# Altium footprint library Ultrascale_PcbLib.PcbLib: 126 footprints (part 7 of 8)
Each footprint in its own frame and in the unit in brackets; x right, y up, seen from the top. Pads: shape width x height; smd on the part's side, far side on the other; paste and mask are expansions set on the pad; w line width, h text height; cw(c..) or ccw(c..) is an arc to the next point about the centre after c.
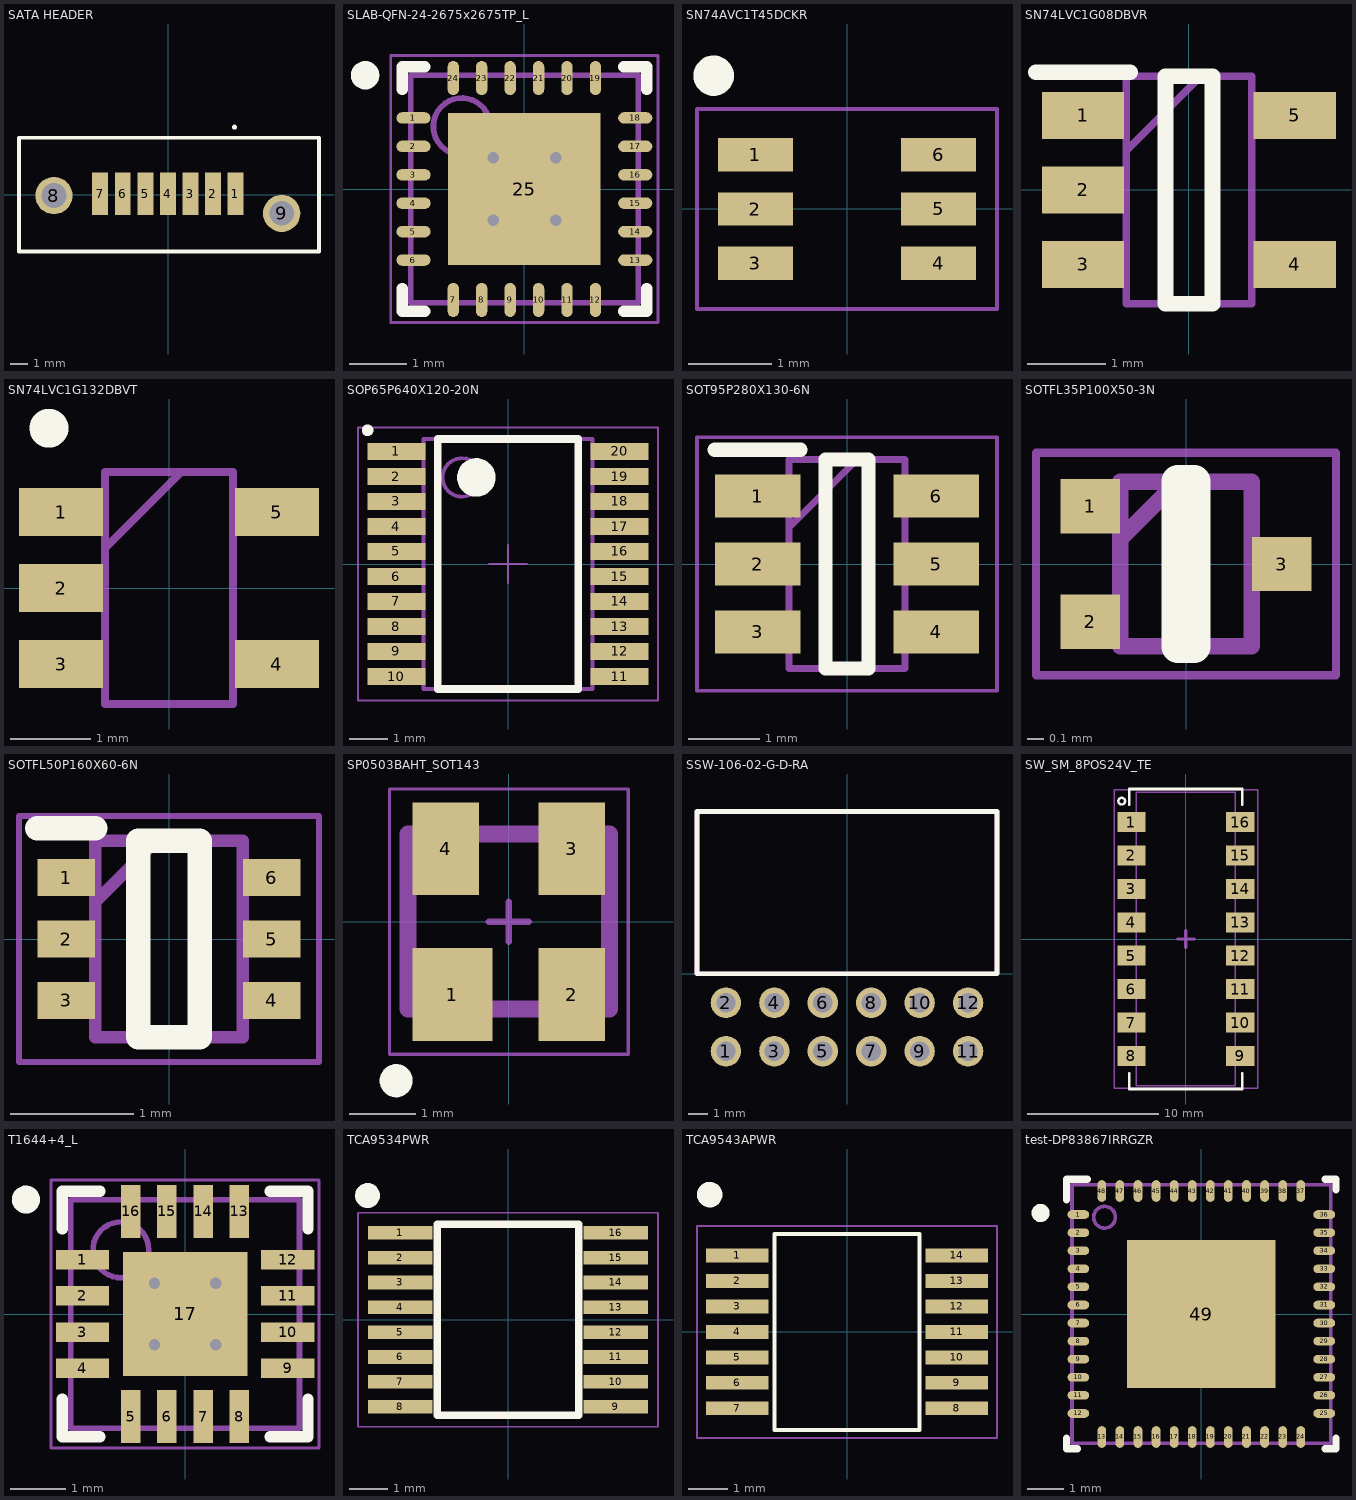
[diagram p6: the footprints below, top view; thin cyan lines are the x and y axes]

## SATA HEADER [mm] "CONN HEADER 7POS VERT SMD 15GOLD"
pads (9):
  rect 0.9x2.4 smd: 1(3.795,0.05) 2(2.525,0.05) 3(1.255,0.05) 4(-0.015,0.05) 5(-1.285,0.05) 6(-2.555,0.05) 7(-3.825,0.05)
  round 2.1 hole 1.4: 8(-6.43,-0.05) 9(6.4,-1.05)
Top Overlay:
  circle w0.2: c3.737,3.8 r0.04
  lines w0.2: -8.4,-3.2 -8.4,3.2 8.5,3.2 8.5,-3.2 -8.4,-3.2
3D body "678005005.stp": height 8.41, standoff -2.64, extent -8.45,-3.225 8.45,3.225

## SLAB-QFN-24-2675x2675TP_L [mm] "QFN, 24-Leads, Body 4x4mm, Pitch 0.5mm, Thermal Pad 2.68x2.68mm, IPC High Density"
height 0.8
pads (25):
  oval 0.6x0.2 smd mask+0.05: 1(-1.95,1.25) 2(-1.95,0.75) 3(-1.95,0.25) 4(-1.95,-0.25) 5(-1.95,-0.75) 6(-1.95,-1.25) 13(1.95,-1.25) 14(1.95,-0.75) 15(1.95,-0.25) 16(1.95,0.25) 17(1.95,0.75) 18(1.95,1.25)
  oval 0.2x0.6 smd mask+0.05: 7(-1.25,-1.95) 8(-0.75,-1.95) 9(-0.25,-1.95) 10(0.25,-1.95) 11(0.75,-1.95) 12(1.25,-1.95) 19(1.25,1.95) 20(0.75,1.95) 21(0.25,1.95) 22(-0.25,1.95) 23(-0.75,1.95) 24(-1.25,1.95)
  rect 2.68x2.68 smd mask+0.05: 25(0,0)
via -0.55,0.55 diameter 0.5 hole 0.2
via 0.55,0.55 diameter 0.5 hole 0.2
via -0.55,-0.55 diameter 0.5 hole 0.2
via 0.55,-0.55 diameter 0.5 hole 0.2
Top Overlay:
  circle w0.25: c-2.8,2 r0.125
  lines w0.2: -2.15,-1.75 -2.15,-2.15 -1.75,-2.15 ; -2.15,1.75 -2.15,2.15 -1.75,2.15 ; 1.75,-2.15 2.15,-2.15 2.15,-1.75 ; 1.75,2.15 2.15,2.15 2.15,1.75
Mechanical 13:
  circle w0.1: c-1.1,1.1 r0.5
  lines w0.1: -2,-2 -2,2 2,2 2,-2 -2,-2
Mechanical 15:
  lines w0.05: -2.35,-2.35 -2.35,2.35 2.35,2.35 2.35,-2.35 -2.35,-2.35
  lines w0.1: -0.5,0 0.5,0 ; 0,-0.5 0,0.5
3D body: height 0.8, standoff 0, extent -2,-2 2,2

## SN74AVC1T45DCKR [mm] "IC BUS TRANSCVR TRI-ST SC70-6"
pads (6):
  rect 0.9x0.4 smd mask+0.05: 1(-1.1,0.65) 2(-1.1,0) 3(-1.1,-0.65) 4(1.1,-0.65) 5(1.1,0) 6(1.1,0.65)
Top Overlay:
  circle w0.325: c-1.6,1.6 r0.08
Mechanical 20:
  lines w0.05: -1.8,-1.2 1.8,-1.2 1.8,1.2 -1.8,1.2 -1.8,-1.2
3D body "DCK6.step": height 1.09, standoff 0, extent -1.206,-1.08 1.206,1.08

## SN74LVC1G08DBVR [mm] "IC GATE AND 1CH 2-INP SOT-23-5"
pads (5):
  rect 1.05x0.6 smd mask+0.07: 1(-1.35,0.95) 2(-1.35,0) 3(-1.35,-0.95) 4(1.35,-0.95) 5(1.35,0.95)
Top Overlay:
  lines w0.2: -1.95,1.5 -0.75,1.5 ; -0.3,-1.45 -0.3,1.45 0.3,1.45 0.3,-1.45 -0.3,-1.45
Mechanical 15:
  lines w0.1: -0.8,0.5 0.15,1.45 ; -0.8,-1.45 -0.8,1.45 0.8,1.45 0.8,-1.45 -0.8,-1.45
3D body "SN74LVC1G08DBVR.stp": height 1.45, standoff 0, extent -1.4,-1.45 1.4,1.45

## SN74LVC1G132DBVT [mm] "IC GATE NAND 1CH 2-INP SOT-23-5"
pads (5):
  rect 1.05x0.6 smd mask+0.07: 1(-1.35,0.95) 2(-1.35,0) 3(-1.35,-0.95) 4(1.35,-0.95) 5(1.35,0.95)
Top Overlay:
  circle w0.325: c-1.5,2 r0.08
Mechanical 15:
  lines w0.1: -0.8,0.5 0.15,1.45 ; -0.8,-1.45 0.8,-1.45 0.8,1.45 -0.8,1.45 -0.8,-1.45
3D body "DBV5.step": height 1.45, standoff 0, extent -1.499,-1.524 1.499,1.524

## SOP65P640X120-20N [mm] "SOP, 20-Leads, Body 6.5x4.4mm, Pitch 0.65mm, IPC Medium Density"
height 1.2
pads (20):
  rect 1.5x0.45 smd: 1(-2.9,2.925) 2(-2.9,2.275) 3(-2.9,1.625) 4(-2.9,0.975) 5(-2.9,0.325) 6(-2.9,-0.325) 7(-2.9,-0.975) 8(-2.9,-1.625) 9(-2.9,-2.275) 10(-2.9,-2.925) 11(2.9,-2.925) 12(2.9,-2.275) 13(2.9,-1.625) 14(2.9,-0.975) 15(2.9,-0.325) 16(2.9,0.325) 17(2.9,0.975) 18(2.9,1.625) 19(2.9,2.275) 20(2.9,2.925)
Top Overlay:
  circle w0.5: c-0.825,2.25 r0.25
  circle w0.254: c-3.65,3.475 r0.025
  lines w0.2: -1.825,-3.25 1.825,-3.25 1.825,3.25 -1.825,3.25 -1.825,-3.25
Mechanical 14:
  circle w0.1: c-1.2,2.25 r0.5
  lines w0.1: -2.2,-3.25 2.2,-3.25 2.2,3.25 -2.2,3.25 -2.2,-3.25
Mechanical 15:
  lines w0.05: -0.5,0 0.5,0 ; 0,-0.5 0,0.5 ; -3.9,-3.55 3.9,-3.55 3.9,3.55 -3.9,3.55 -3.9,-3.55
3D body "SOP65P640X120-20N.stp": height 1.2, standoff 0, extent -3.121,-3.3 3.121,3.3

## SOT95P280X130-6N [mm] "TVS DIODE 20VWM SMD"
pads (6):
  rect 1.2x0.6 smd: 1(-1.25,0.95) 2(-1.25,0) 3(-1.25,-0.95) 4(1.25,-0.95) 5(1.25,0) 6(1.25,0.95)
Top Overlay:
  lines w0.2: -1.85,1.6 -0.65,1.6 ; -0.3,-1.462 0.3,-1.462 0.3,1.462 -0.3,1.462 -0.3,-1.462
Mechanical 15:
  lines w0.1: -0.812,0.512 0.138,1.462 ; -0.812,-1.462 0.812,-1.462 0.812,1.462 -0.812,1.462 -0.812,-1.462
Mechanical 20:
  lines w0.05: -2.1,-1.775 2.1,-1.775 2.1,1.775 -2.1,1.775 -2.1,-1.775

## SOTFL35P100X50-3N [mm] "TVS DIODE 5.5VWM 8VC SOT3"
pads (3):
  rect 0.36x0.33 smd: 1(-0.58,0.35) 2(-0.58,-0.35) 3(0.58,0)
Top Overlay:
  lines w0.2: -0.05,-0.5 0.05,-0.5 0.05,0.5 -0.05,0.5 -0.05,-0.5
Mechanical 15:
  lines w0.1: -0.4,0.15 -0.05,0.5 ; -0.4,-0.5 0.4,-0.5 0.4,0.5 -0.4,0.5 -0.4,-0.5
Mechanical 20:
  lines w0.05: -0.91,-0.675 0.91,-0.675 0.91,0.675 -0.91,0.675 -0.91,-0.675

## SOTFL50P160X60-6N [mm] "TVS DIODE 5.5VWM SOT6"
pads (6):
  rect 0.47x0.3 smd: 1(-0.835,0.5) 2(-0.835,0) 3(-0.835,-0.5) 4(0.835,-0.5) 5(0.835,0) 6(0.835,0.5)
Top Overlay:
  lines w0.2: -1.07,0.9 -0.6,0.9 ; -0.25,-0.8 -0.25,0.8 0.25,0.8 0.25,-0.8 -0.25,-0.8
Mechanical 15:
  lines w0.1: -0.6,0.3 -0.1,0.8 ; -0.6,-0.8 -0.6,0.8 0.6,0.8 0.6,-0.8 -0.6,-0.8
Mechanical 20:
  lines w0.05: -1.22,-1 -1.22,1 1.22,1 1.22,-1 -1.22,-1
3D body "DRL6.step": height 0.61, standoff 0, extent -0.851,-0.851 0.851,0.851

## SP0503BAHT_SOT143 [mm] "LITTELFUSE TVS DIODE 5.5VWM 8.5VC SOT143"
height 1.22
pads (4):
  rect 1.2x1.4 smd paste+0.05: 1(-0.85,-1.1)
  rect 1x1.4 smd paste+0.05: 2(0.95,-1.1) 3(0.95,1.1) 4(-0.95,1.1)
Top Overlay:
  circle w0.25: c-1.7,-2.4 r0.125
Mechanical 13:
  lines w0.254: -1.52,-1.32 1.52,-1.32 1.52,1.32 -1.52,1.32 -1.52,-1.32
Mechanical 15:
  lines w0.05: -1.8,-2 1.8,-2 1.8,2 -1.8,2 -1.8,-2
  lines w0.1: -0.3,0 0.3,0 ; 0,-0.3 0,0.3
3D body: height 1.22, standoff 0, extent -1.52,-1.32 1.52,1.32

## SSW-106-02-G-D-RA [mm]
pads (12):
  round 1.6 hole 1.02: 1(-6.35,-4.064) 2(-6.35,-1.524) 3(-3.81,-4.064) 4(-3.81,-1.524) 5(-1.27,-4.064) 6(-1.27,-1.524) 7(1.27,-4.064) 8(1.27,-1.524) 9(3.81,-4.064) 10(3.81,-1.524) 11(6.35,-4.064) 12(6.35,-1.524)
Top Overlay:
  lines w0.254: -7.87,0 7.87,0 7.87,8.51 -7.87,8.51 -7.87,0
Mechanical 15:
  lines w0.254: -7.87,0 -7.87,8.51 7.87,8.51 7.87,0 -7.87,0
3D body "SSW-106-02-T-D-RA.stp": height 4.97, standoff -2.51, extent -7.874,-4.267 7.874,8.509

## SW_SM_8POS24V_TE [mil] "Switch DIP8 SMD Gull Wing"
height 137.8
pads (16):
  rect 85x60 smd: 1(-162.6,350) 2(-162.6,250) 3(-162.6,150) 4(-162.6,50) 5(-162.6,-50) 6(-162.6,-150) 7(-162.6,-250) 8(-162.6,-350) 9(162.6,-350) 10(162.6,-250) 11(162.6,-150) 12(162.6,-50) 13(162.6,50) 14(162.6,150) 15(162.6,250) 16(162.6,350)
Top Overlay:
  circle w7.01: c-191.83,412.35 r10.09
  lines w7.87: -169.29,-401.57 -169.29,-448.82 169.29,-448.82 169.29,-440.94 169.29,-401.57 ; -169.29,401.57 -169.29,440.94 -169.29,448.82 169.29,448.82 169.29,401.57
Mechanical 11:
  lines w3.94: -147.64,-438.98 147.64,-438.98 147.64,438.98 -147.64,438.98 -147.64,-438.98
  text "1" at -100,350 h39.37
Mechanical 15:
  lines w3.94: -213.58,-446.85 -213.58,446.85 214.57,446.85 214.57,-446.85 -213.58,-446.85
  lines w10: -25,0 25,0 ; 0,-25 0,25
3D body "DIP8_SMD_gullwing_c-1-1825058-9-o-3d.stp": height 215.75, standoff -0.79, extent -184.78,-438.98 184.79,438.97

## T1644+4_L [mm] "QFN, 16-Leads, Body 4x4mm, Pitch 0.65mm, Thermal Pad 2.3x2.3mm, IPC High Density"
height 0.8
pads (17):
  rect 0.95x0.35 smd mask+0.05: 1(-1.84,0.975) 2(-1.84,0.325) 3(-1.84,-0.325) 4(-1.84,-0.975) 9(1.84,-0.975) 10(1.84,-0.325) 11(1.84,0.325) 12(1.84,0.975)
  rect 0.35x0.95 smd mask+0.05: 5(-0.975,-1.84) 6(-0.325,-1.84) 7(0.325,-1.84) 8(0.975,-1.84) 13(0.975,1.84) 14(0.325,1.84) 15(-0.325,1.84) 16(-0.975,1.84)
  rect 2.23x2.23 smd mask+0.05: 17(0,0)
via -0.55,0.55 diameter 0.5 hole 0.2
via 0.55,0.55 diameter 0.5 hole 0.2
via -0.55,-0.55 diameter 0.5 hole 0.2
via 0.55,-0.55 diameter 0.5 hole 0.2
Top Overlay:
  circle w0.25: c-2.85,2.05 r0.125
  lines w0.2: -2.2,-1.525 -2.2,-2.2 -1.525,-2.2 ; -2.2,1.525 -2.2,2.2 -1.525,2.2 ; 1.525,-2.2 2.2,-2.2 2.2,-1.525 ; 1.525,2.2 2.2,2.2 2.2,1.525
Mechanical 13:
  circle w0.1: c-1.15,1.15 r0.5
  lines w0.1: -2.05,-2.05 -2.05,2.05 2.05,2.05 2.05,-2.05 -2.05,-2.05
Mechanical 15:
  lines w0.05: -2.4,-2.4 -2.4,2.4 2.4,2.4 2.4,-2.4 -2.4,-2.4
  lines w0.1: -0.5,0 0.5,0 ; 0,-0.5 0,0.5
3D body: height 0.8, standoff 0, extent -2.05,-2.05 2.05,2.05

## TCA9534PWR [mil] "IC I/O EXPANDER I2C 8B 16TSSOP"
pads (16):
  rect 66x14 smd: 1(-111,89.57) 2(-111,63.98) 3(-111,38.39) 4(-111,12.8) 5(-111,-12.8) 6(-111,-38.39) 7(-111,-63.98) 8(-111,-89.57) 9(111,-89.57) 10(111,-63.98) 11(111,-38.39) 12(111,-12.8) 13(111,12.8) 14(111,38.39) 15(111,63.98) 16(111,89.57)
Top Overlay:
  circle w12.8: c-144.69,127.95 r6.42
  lines w7.87: -72.83,-98.43 72.83,-98.43 72.83,98.43 -72.83,98.43 -72.83,-98.43
Mechanical 20:
  lines w1.97: -154.53,-110.24 154.53,-110.24 154.53,110.24 -154.53,110.24 -154.53,-110.24
3D body "TCA9534PWR.stp": height 47.24, standoff 0, extent -125.98,-98.42 125.99,98.43

## TCA9543APWR [mm] "IC I2C SW 2CH W/RESET 14TSSOP"
pads (14):
  rect 1.6x0.35 smd mask+0.07: 1(-2.8,1.95) 2(-2.8,1.3) 3(-2.8,0.65) 4(-2.8,0) 5(-2.8,-0.65) 6(-2.8,-1.3) 7(-2.8,-1.95) 8(2.8,-1.95) 9(2.8,-1.3) 10(2.8,-0.65) 11(2.8,0) 12(2.8,0.65) 13(2.8,1.3) 14(2.8,1.95)
Top Overlay:
  circle w0.325: c-3.5,3.5 r0.163
  lines w0.1: -1.85,-2.5 -1.85,2.5 1.85,2.5 1.85,-2.5 -1.85,-2.5
Mechanical 20:
  lines w0.05: -3.825,-2.7 3.825,-2.7 3.825,2.7 -3.825,2.7 -3.825,-2.7
3D body "TCA9543APWR.stp": height 1.2, standoff 0, extent -3.2,-2.5 3.2,2.5

## test-DP83867IRRGZR [mm] "Ethernet Switch"
pads (49):
  oval 0.6x0.24 smd paste+0 mask+0.051: 1(-3.4,2.75) 2(-3.4,2.25) 3(-3.4,1.75) 4(-3.4,1.25) 5(-3.4,0.75) 6(-3.4,0.25) 7(-3.4,-0.25) 8(-3.4,-0.75) 9(-3.4,-1.25) 10(-3.4,-1.75) 11(-3.4,-2.25) 12(-3.4,-2.75) 25(3.4,-2.75) 26(3.4,-2.25) 27(3.4,-1.75) 28(3.4,-1.25) 29(3.4,-0.75) 30(3.4,-0.25) 31(3.4,0.25) 32(3.4,0.75) 33(3.4,1.25) 34(3.4,1.75) 35(3.4,2.25) 36(3.4,2.75)
  oval 0.24x0.6 smd paste+0 mask+0.051: 13(-2.75,-3.4) 14(-2.25,-3.4) 15(-1.75,-3.4) 16(-1.25,-3.4) 17(-0.75,-3.4) 18(-0.25,-3.4) 19(0.25,-3.4) 20(0.75,-3.4) 21(1.25,-3.4) 22(1.75,-3.4) 23(2.25,-3.4) 24(2.75,-3.4) 37(2.75,3.4) 38(2.25,3.4) 39(1.75,3.4) 40(1.25,3.4) 41(0.75,3.4) 42(0.25,3.4) 43(-0.25,3.4) 44(-0.75,3.4) 45(-1.25,3.4) 46(-1.75,3.4) 47(-2.25,3.4) 48(-2.75,3.4)
  rect 4.1x4.1 smd paste-2.037 mask+0.051: 49(0,0)
Top Overlay:
  circle w0.25: c-4.445,2.794 r0.125
  lines w0.2: -3.725,-3.425 -3.725,-3.725 -3.425,-3.725 ; -3.725,3.15 -3.725,3.725 -3.15,3.725 ; 3.425,-3.725 3.725,-3.725 3.725,-3.425 ; 3.425,3.725 3.725,3.725 3.725,3.425
Top Paste:
  region: 0.1,1.835 0.1,0.1 1.835,0.1 1.835,1.835
  region: -0.1,0.1 -0.1,1.835 -1.835,1.835 -1.835,0.1
  region: -0.1,-1.835 -0.1,-0.1 -1.835,-0.1 -1.835,-1.835
  region: 0.1,-0.1 0.1,-1.835 1.835,-1.835 1.835,-0.1
Mechanical 13:
  circle w0.1: c-2.675,2.675 r0.3
  lines w0.1: -3.575,-3.575 3.575,-3.575 3.575,3.575 -3.575,3.575 -3.575,-3.575
3D body: height 0.25, standoff 0, extent 0,0 0.254,0.254
3D body "RGZ0048B.stp": height 1, standoff 0, extent -3.5,-3.5 3.5,3.5